# Altium footprint library CD's_LIB_2018.PcbLib: 155 footprints (part 2 of 10)
Each footprint in its own frame and in the unit in brackets; x right, y up, seen from the top. Pads: shape width x height; smd on the part's side, far side on the other; paste and mask are expansions set on the pad; w line width, h text height; cw(c..) or ccw(c..) is an arc to the next point about the centre after c.
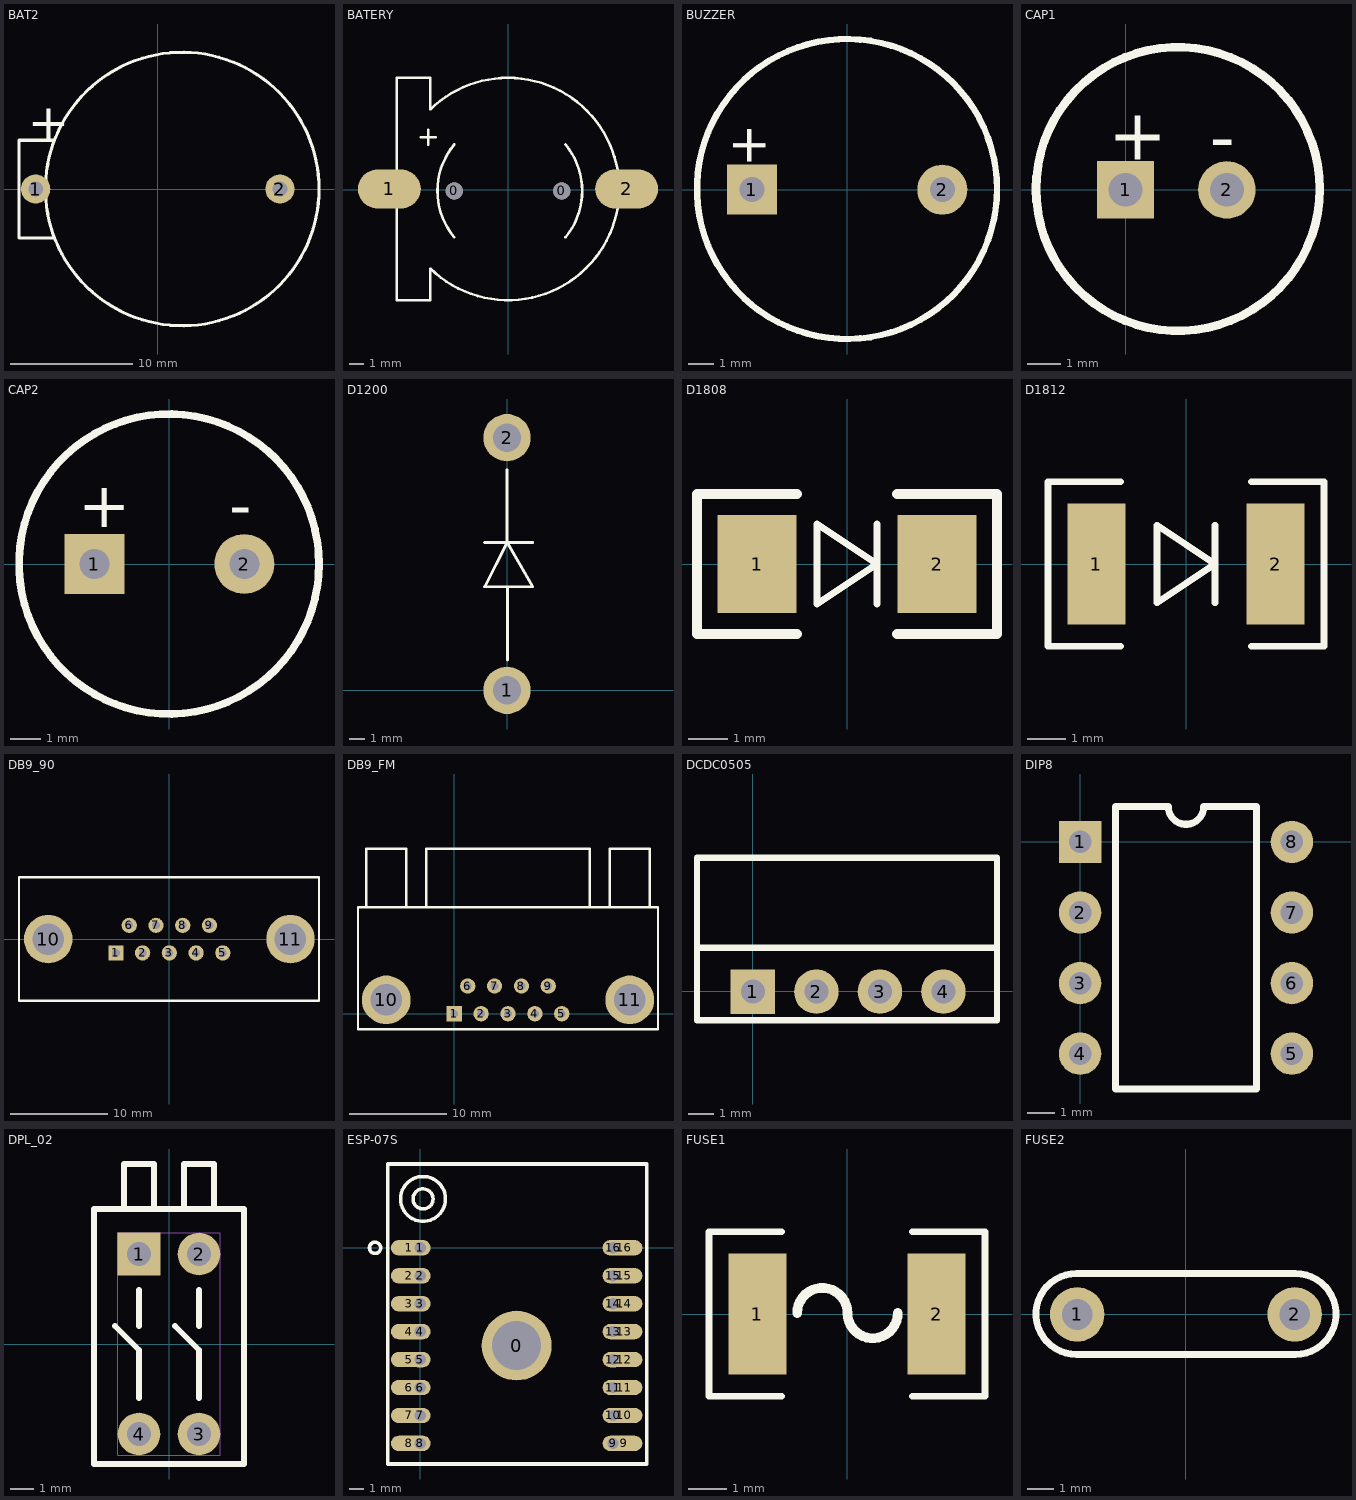
[diagram p1: the footprints below, top view; thin cyan lines are the x and y axes]

## BAT2 [mm]
pads (2):
  round 2.4 hole 1.2: 1(-10,0) 2(10,0)
Top Overlay:
  circle w0.254: c2,0 r11.195
  lines w0.254: -8.516,-4.013 -11.36,-4.013 -11.36,3.988 -8.516,3.988
  text "+" at -10.624,4.013 h3
3D body: height 7.66, standoff -4.6, extent -11.059,-11.126 13.109,11.009

## BATERY [mil]
pads (4):
  round 46 hole 46: 0(-145,-2.5) 0(145,-2.5)
  oval 169.29x106.3 smd: 1(-320,2.5) 2(320,2.5)
Top Overlay:
  lines w7: -235,142.5 -195,142.5 ; -215,122.5 -215,162.5 ; -209.62,-212.11 -210,-297.5 -300,-297.5 -300,2.5 -300,302.5 -210,302.5 -209.62,217.11 ; -209.52,-212.21 ccw(c0,2.5) 298.19,-30.42 ; -209.52,217.21 cw(c0,2.5) 0,302.5 cw(c0,2.5) 298.19,35.42 ; -145.23,-127.22 cw(c5,-2.5) -145.01,122.49 ; 155.01,-127.49 ccw(c5,-2.5) 155.01,122.49
3D body: height 194.49, standoff 0, extent -361,-292.71 367.35,297.71

## BUZZER [mm]
pads (2):
  rect 2x2 hole 1: 1(-3.81,0)
  round 2 hole 1: 2(3.81,0)
Top Overlay:
  circle w0.254: c0,0.025 r6
  text "+" at -4.553,2.642 h1.52
3D body: height 9.5, standoff -3.5, extent -6,-5.971 6,6.022

## CAP1 [mm]
pads (2):
  rect 1.7x1.7 hole 1: 1(0,0)
  round 1.7 hole 1: 2(3,0)
Top Overlay:
  circle w0.254: c1.549,0.025 r4.2
  text "+" at -0.508,0.889 h1.52
  text "-" at 2.489,0.838 h1.52

## CAP2 [mm]
pads (2):
  rect 2x2 hole 1: 1(-2.5,0)
  round 2 hole 1: 2(2.5,0)
Top Overlay:
  circle w0.254: c-0.009,0 r5
  text "-" at 1.996,1.219 h1.52
  text "+" at -3.033,1.219 h1.52
3D body: height 10.16, standoff -2.3, extent -5.08,-5.08 5.08,5.08

## D1200 [mm]
pads (2):
  round 3 hole 1.8: 1(0,0) 2(0,16)
Top Overlay:
  lines w0.178: -1.424,9.359 1.624,9.359 ; -0.001,13.972 -0.001,9.359 ; 0.031,1.924 0.031,6.565 ; -0.001,9.359 -1.424,6.565 1.624,6.565 -0.001,9.359

## D1808 [mm]
pads (2):
  rect 2x2.5 smd: 1(-2.286,0) 2(2.286,0)
Top Overlay:
  lines w0.178: 0.762,-1.016 0.762,1.016 ; -0.762,-1.016 0.762,0 -0.762,1.016 -0.762,-1.016
  lines w0.254: -1.27,-1.778 -3.81,-1.778 -3.81,1.778 -1.27,1.778 ; 1.27,-1.778 3.81,-1.778 3.81,1.778 1.27,1.778
3D body: height 2.4, standoff 0, extent -2.3,-1.35 2.3,1.35

## D1812 [mil]
pads (2):
  rect 60x125 smd: 1(-92.5,0) 2(92.5,0)
Top Overlay:
  lines w7: -67.5,-85 -142.5,-85 -142.5,85 -67.5,85 ; 30,-40 30,40 ; 67.5,-85 142.5,-85 142.5,85 67.5,85 ; -30,-40 -30,40 30,0 -30,-40
3D body: height 98.43, standoff 0, extent -110.23,-76.77 110.24,76.78

## DB9_90 [mm]
pads (11):
  rect 1.575x1.575 hole 0.8: 1(-5.52,-1.42)
  round 1.575 hole 0.8: 2(-2.76,-1.42) 3(0,-1.42) 4(2.76,-1.42) 5(5.52,-1.42) 6(-4.14,1.42) 7(-1.38,1.42) 8(1.38,1.42) 9(4.14,1.42)
  round 5 hole 3.25: 10(-12.5,0) 11(12.5,0)
Top Overlay:
  lines w0.254: -15.519,-6.35 15.443,-6.35 15.443,6.375 -15.519,6.375 -15.519,-6.35
3D body: height 13.4, standoff -4.46, extent -15.405,-6.274 15.405,6.274

## DB9_FM [mm]
pads (11):
  rect 1.575x1.575 hole 0.8: 1(0,0)
  round 1.575 hole 0.8: 2(2.76,0) 3(5.52,0) 4(8.28,0) 5(11.04,0) 6(1.38,2.84) 7(4.14,2.84) 8(6.9,2.84) 9(9.66,2.84)
  round 5 hole 3.25: 10(-6.98,1.42) 11(18.02,1.42)
Top Overlay:
  lines w0.254: -9.05,10.92 -9.05,16.92 -4.94,16.92 ; -4.91,10.92 -4.91,16.92 ; -2.85,10.92 -2.85,16.92 13.9,16.92 13.9,10.92 ; 15.95,10.92 15.95,16.92 20.06,16.92 ; 20.09,10.92 20.09,16.92 ; -9.88,-1.58 -9.88,10.92 20.92,10.92 20.92,-1.58 -9.88,-1.58
3D body: height 12.81, standoff -2.91, extent -9.925,-2.012 20.885,17.063

## DCDC0505 [mil]
pads (4):
  rect 70x70 hole 38: 1(0.02,-0.3)
  round 70 hole 38: 2(100.02,-0.3) 3(200.02,-0.3) 4(300.02,-0.3)
Top Overlay:
  lines w10: -87.98,68.7 382.46,68.7 ; -87.98,-45.3 384.46,-45.3 384.46,210.61 -87.98,210.61 -87.98,-45.3
3D body: height 354.33, standoff 0, extent -80,-39 377,203

## DIP8 [mil]
pads (8):
  rect 60x60 hole 32: 1(0,0)
  round 60 hole 32: 2(0,-100) 3(0,-200) 4(0,-300) 5(300,-300) 6(300,-200) 7(300,-100) 8(300,0)
Top Overlay:
  lines w10: 50,-350 250,-350 250,50 175,50 cw(c150,50) 125,50 50,50 50,-350

## DPL_02 [mil] "DPL_02"
pads (4):
  rect 71x71 hole 40: 1(-50,150.01)
  round 71 hole 40: 2(50,150.01) 3(50,-149.99) 4(-50,-149.99)
Top Overlay:
  lines w10: -90,30.01 -50,-9.99 -50,-29.99 -50,-89.99 ; -75,225.01 -75,300.01 -25,300.01 -25,225.01 ; -50,30.01 -50,90.01 ; 10,30.01 50,-9.99 50,-29.99 50,-89.99 ; 25,225.01 25,300.01 75,300.01 75,225.01 ; 50,30.01 50,90.01 ; -125,-199.99 125,-199.99 125,225.01 -125,225.01 -125,-199.99
Mechanical 8:
  text "3" at 40,-149.99 h25
  text "4" at -60,-149.99 h25
  text "2" at 40,150.01 h25
  text "1" at -60,150.01 h25
Mechanical 9:
  lines w1: -85.43,-185.43 85.43,-185.43 85.43,185.44 -85.43,185.44 -85.43,-185.43
Mechanical 10:
  lines w1: -85.43,-185.43 85.43,-185.43 85.43,185.44 -85.43,185.44 -85.43,-185.43

## ESP-07S [mm]
pads (33):
  round 5 hole 3.5: 0(6.9,-7)
  oval 2.6x1.1 smd: 1(-0.8,0) 2(-0.8,-2) 3(-0.8,-4) 4(-0.8,-6) 5(-0.8,-8) 6(-0.8,-10) 7(-0.8,-12) 8(-0.8,-14) 9(14.6,-14) 10(14.6,-12) 11(14.6,-10) 12(14.6,-8) 13(14.6,-6) 14(14.6,-4) 15(14.6,-2) 16(14.6,0)
  oval 1.5x1.1 hole 0.8: 1(0,0) 2(0,-2) 3(0,-4) 4(0,-6) 5(0,-8) 6(0,-10) 7(0,-12) 8(0,-14) 9(13.8,-14) 10(13.8,-12) 11(13.8,-10) 12(13.8,-8) 13(13.8,-6) 14(13.8,-4) 15(13.8,-2) 16(13.8,0)
Top Overlay:
  circle w0.254: c-3.234,0 r0.402
  circle w0.254: c0.2,3.5 r0.718
  circle w0.254: c0.2,3.5 r1.606
  lines w0.254: -2.324,-15.476 16.2,-15.476 16.2,6 -2.324,6 -2.324,-15.476

## FUSE1 [mil]
pads (2):
  rect 60x125 smd: 1(-92.5,0) 2(92.5,0)
Top Overlay:
  lines w7: -67.5,-85 -142.5,-85 -142.5,85 -67.5,85 ; 67.5,-85 142.5,-85 142.5,85 67.5,85
  lines w10: -51.5,1 cw(c-25.5,1) 0.5,1 ccw(c26.5,1) 52.5,1
3D body: height 40.75, standoff 0, extent -93.11,-68.5 93.31,68.51

## FUSE2 [mil]
pads (2):
  round 80 hole 45: 1(-159.82,0.01) 2(159.82,-0.01)
Top Overlay:
  lines w10: -160.81,-58.75 cw(c-160.76,0.68) -160.82,60.12 161.04,60.12 cw(c161,0.67) 161.06,-58.77 -160.81,-58.75